# Altium footprint library 1541 Interface for ZX-81.PcbLib: 24 footprints (part 1 of 2)
Each footprint in its own frame and in the unit in brackets; x right, y up, seen from the top. Pads: shape width x height; smd on the part's side, far side on the other; paste and mask are expansions set on the pad; w line width, h text height; cw(c..) or ccw(c..) is an arc to the next point about the centre after c.
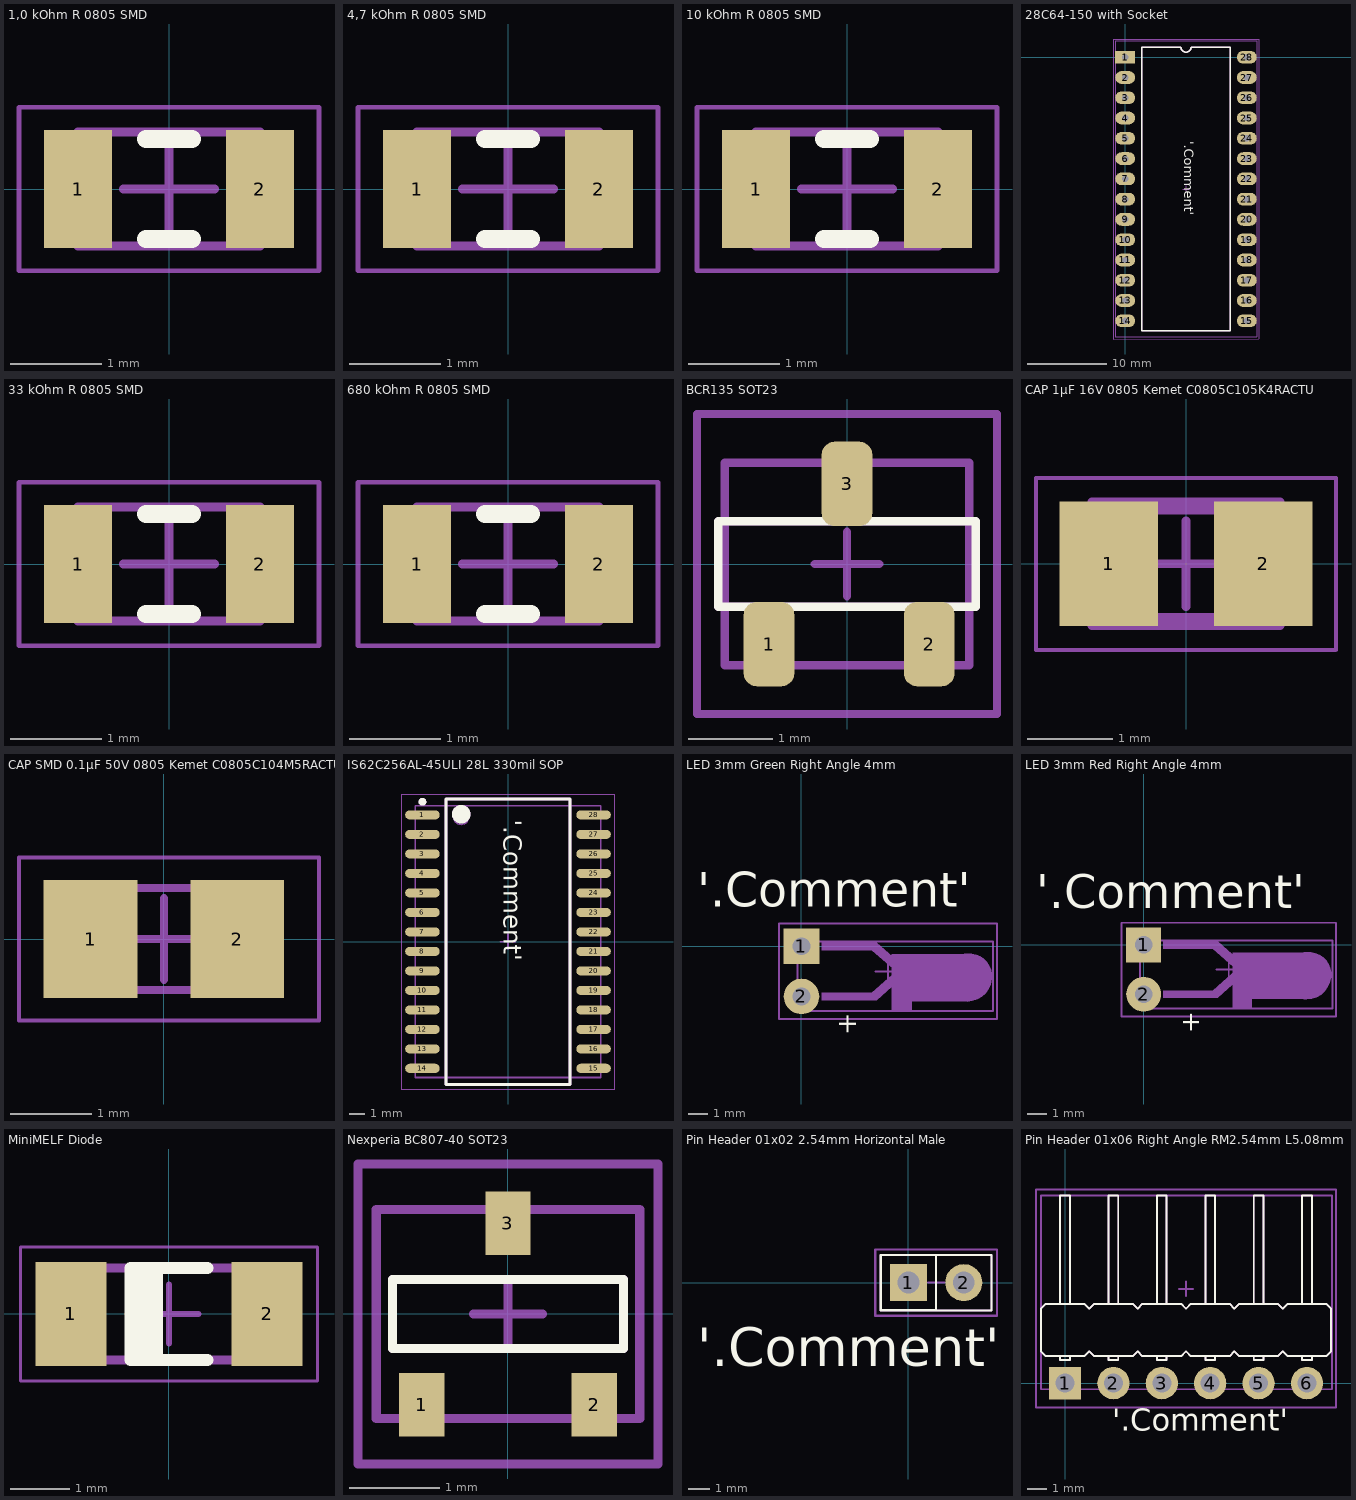
[diagram p0: the footprints below, top view; thin cyan lines are the x and y axes]

## 1,0 kOhm R 0805 SMD [mm] "Chip Resistor, 2-Leads, Body 2,00x1,25mm, IPC Medium Density"
height 0.5
pads (2):
  rect 0.75x1.3 smd: 1(-1,0) 2(1,0)
Top Overlay:
  lines w0.2: -0.25,-0.55 0.25,-0.55 ; -0.25,0.55 0.25,0.55
Top 3D Body:
  lines w0.1: -1,-0.625 -1,0.625 1,0.625 1,-0.625 -1,-0.625
Top Courtyard:
  lines w0.05: -1.65,-0.9 -1.65,0.9 1.65,0.9 1.65,-0.9 -1.65,-0.9
  lines w0.1: -0.5,0 0.5,0 ; 0,-0.5 0,0.5
Top Assembly:
  lines w0.1: -1,-0.625 1,-0.625 1,0.625 -1,0.625 -1,-0.625
  text "'.Designator'" at 2.034,-0.654 h2
  text "'.Comment'" at -0.843,1.263 h2
3D body: height 0.5, standoff 0, extent -1,-0.625 -0.65,0.625
3D body: height 0.5, standoff 0, extent 0.65,-0.625 1,0.625
3D body "Yageo RC0805 Resistor Series 102.stp": height 0.5, standoff 0, extent -1,-0.625 1,0.625

## 4,7 kOhm R 0805 SMD [mm] "Chip Resistor, 2-Leads, Body 2,00x1,25mm, IPC Medium Density"
height 0.5
pads (2):
  rect 0.75x1.3 smd: 1(-1,0) 2(1,0)
Top Overlay:
  lines w0.2: -0.25,-0.55 0.25,-0.55 ; -0.25,0.55 0.25,0.55
Top 3D Body:
  lines w0.1: -1,-0.625 -1,0.625 1,0.625 1,-0.625 -1,-0.625
Top Courtyard:
  lines w0.05: -1.65,-0.9 -1.65,0.9 1.65,0.9 1.65,-0.9 -1.65,-0.9
  lines w0.1: -0.5,0 0.5,0 ; 0,-0.5 0,0.5
Top Assembly:
  lines w0.1: -1,-0.625 1,-0.625 1,0.625 -1,0.625 -1,-0.625
  text "'.Designator'" at -3.182,1.522 h2
  text "'.Comment'" at 1.9,1.389 h2
3D body: height 0.5, standoff 0, extent -1,-0.625 -0.65,0.625
3D body: height 0.5, standoff 0, extent 0.65,-0.625 1,0.625
3D body "Yageo RC0805 Resistor Series 472.stp": height 0.5, standoff 0, extent -1,-0.625 1,0.625

## 10 kOhm R 0805 SMD [mm] "Chip Resistor, 2-Leads, Body 2,00x1,25mm, IPC Medium Density"
height 0.5
pads (2):
  rect 0.75x1.3 smd: 1(-1,0) 2(1,0)
Top Overlay:
  lines w0.2: -0.25,-0.55 0.25,-0.55 ; -0.25,0.55 0.25,0.55
Top 3D Body:
  lines w0.1: -1,-0.625 -1,0.625 1,0.625 1,-0.625 -1,-0.625
Top Courtyard:
  lines w0.05: -1.65,-0.9 -1.65,0.9 1.65,0.9 1.65,-0.9 -1.65,-0.9
  lines w0.1: -0.5,0 0.5,0 ; 0,-0.5 0,0.5
Top Assembly:
  lines w0.1: -1,-0.625 1,-0.625 1,0.625 -1,0.625 -1,-0.625
  text "'.Designator'" at 3.194,-1.031 h2
  text "'.Comment'" at -1.857,-1.34 h2
3D body: height 0.5, standoff 0, extent -1,-0.625 -0.65,0.625
3D body: height 0.5, standoff 0, extent 0.65,-0.625 1,0.625
3D body "Yageo RC0805 Resistor Series 103.stp": height 0.5, standoff 0, extent -1,-0.625 1,0.625

## 28C64-150 with Socket [mm]
height 1.75
pads (28):
  rect 2.5x1.6 hole 0.8: 1(0,0)
  oval 2.5x1.6 hole 0.8: 2(0,-2.54) 3(0,-5.08) 4(0,-7.62) 5(0,-10.16) 6(0,-12.7) 7(0,-15.24) 8(0,-17.78) 9(0,-20.32) 10(0,-22.86) 11(0,-25.4) 12(0,-27.94) 13(0,-30.48) 14(0,-33.02) 15(15.24,-33.02) 16(15.24,-30.48) 17(15.24,-27.94) 18(15.24,-25.4) 19(15.24,-22.86) 20(15.24,-20.32) 21(15.24,-17.78) 22(15.24,-15.24) 23(15.24,-12.7) 24(15.24,-10.16) 25(15.24,-7.62) 26(15.24,-5.08) 27(15.24,-2.54) 28(15.24,0)
Top Overlay:
  lines w0.2: 2.085,-34.29 13.155,-34.29 13.155,1.27 8.255,1.27 cw(c7.62,1.27) 6.985,1.27 2.085,1.27 2.085,-34.29
  text "'.Comment'" at 6.958,-10.534 h2
Top 3D Body:
  lines w0.1: -1.27,-35.052 -1.27,2.04 16.51,2.04 16.51,-35.052 -1.27,-35.052
Top Courtyard:
  lines w0.1: 7.239,-16.51 8.001,-16.51 ; 7.62,-16.891 7.62,-16.129 ; -1.524,-35.306 -1.524,2.286 16.764,2.286 16.764,-35.306 -1.524,-35.306
Top Assembly:
  lines w0.2: 2.085,-34.29 13.155,-34.29 13.155,1.27 8.255,1.27 cw(c7.62,1.27) 6.985,1.27 2.085,1.27 2.085,-34.29
  text "'.Comment'" at 6.958,-10.534 h2
  text "'.Designator'" at -3.193,-15.485 h2
3D body "28C64-150 with Socket.stp": height 8.64, standoff -2.7, extent -1.27,-35.06 16.51,2.04

## 33 kOhm R 0805 SMD [mm] "Chip Resistor, 2-Leads, Body 2,00x1,25mm, IPC Medium Density"
height 0.5
pads (2):
  rect 0.75x1.3 smd: 1(-1,0) 2(1,0)
Top Overlay:
  lines w0.2: -0.25,-0.55 0.25,-0.55 ; -0.25,0.55 0.25,0.55
Top 3D Body:
  lines w0.1: -1,-0.625 -1,0.625 1,0.625 1,-0.625 -1,-0.625
Top Courtyard:
  lines w0.05: -1.65,-0.9 -1.65,0.9 1.65,0.9 1.65,-0.9 -1.65,-0.9
  lines w0.1: -0.5,0 0.5,0 ; 0,-0.5 0,0.5
Top Assembly:
  lines w0.1: -1,-0.625 1,-0.625 1,0.625 -1,0.625 -1,-0.625
  text "'.Designator'" at 2.139,-0.65 h2
  text "'.Comment'" at -1.4,1.251 h2
3D body: height 0.5, standoff 0, extent -1,-0.625 -0.65,0.625
3D body: height 0.5, standoff 0, extent 0.65,-0.625 1,0.625
3D body "Yageo RC0805 Resistor Series 333.stp": height 0.5, standoff 0, extent -1,-0.625 1,0.625

## 680 kOhm R 0805 SMD [mm] "Chip Resistor, 2-Leads, Body 2,00x1,25mm, IPC Medium Density"
height 0.5
pads (2):
  rect 0.75x1.3 smd: 1(-1,0) 2(1,0)
Top Overlay:
  lines w0.2: -0.25,-0.55 0.25,-0.55 ; -0.25,0.55 0.25,0.55
Top 3D Body:
  lines w0.1: -1,-0.625 -1,0.625 1,0.625 1,-0.625 -1,-0.625
Top Courtyard:
  lines w0.05: -1.65,-0.9 -1.65,0.9 1.65,0.9 1.65,-0.9 -1.65,-0.9
  lines w0.1: -0.5,0 0.5,0 ; 0,-0.5 0,0.5
Top Assembly:
  lines w0.1: -1,-0.625 1,-0.625 1,0.625 -1,0.625 -1,-0.625
  text "'.Comment'" at 1.144,2.558 h2
  text "'.Designator'" at 3.18,-1.031 h2
3D body: height 0.5, standoff 0, extent -1,-0.625 -0.65,0.625
3D body: height 0.5, standoff 0, extent 0.65,-0.625 1,0.625
3D body "Yageo RC0805 Resistor Series 684.stp": height 0.5, standoff 0, extent -1,-0.625 1,0.625

## BCR135 SOT23 [mm]
height 1.75
pads (3):
  rrect50% 0.6x1 smd: 1(-0.924,-0.95) 2(0.976,-0.95) 3(0,0.95)
Top Overlay:
  lines w0.1: -1.524,-0.508 1.524,-0.508 1.524,0.508 -1.524,0.508 -1.524,-0.508
Top 3D Body:
  lines w0.1: -1.45,-1.2 -1.45,1.2 1.45,1.2 1.45,-1.2 -1.45,-1.2
Top Courtyard:
  lines w0.1: -0.381,0 0.381,0 ; 0,-0.381 0,0.381 ; -1.778,-1.778 1.778,-1.778 1.778,1.778 -1.778,1.778 -1.778,-1.778
Top Assembly:
  lines w0.1: -1.524,-0.508 1.524,-0.508 1.524,0.508 -1.524,0.508 -1.524,-0.508
  text "'.Designator'" at -1.113,-3.24 h2
  text "'.Comment'" at -3.276,1.878 h2
3D body "BCR135 SOT23.stp": height 1, standoff 0, extent -1.45,-1.15 1.45,1.15

## CAP 1µF 16V 0805 Kemet C0805C105K4RACTU [mm] "Chip Capacitor, 2-Leads, Body 2,00x1,25mm, IPC Medium Density"
height 1
pads (2):
  rect 1.15x1.45 smd: 1(-0.9,0) 2(0.9,0)
Top 3D Body:
  lines w0.1: -1,-0.625 1,-0.625 1,0.625 -1,0.625 -1,-0.625
Top Courtyard:
  lines w0.05: -1.751,-1.007 1.749,-1.007 ; -1.751,-1 -1.751,1 1.749,1 ; 1.751,-1 1.751,1
  lines w0.1: -0.5,0 0.5,0 ; 0,-0.5 0,0.5
Top Assembly:
  lines w0.1: -1.1,-0.725 -1.1,0.725 1.1,0.725 1.1,-0.725 -1.1,-0.725
  text "'.Designator'" at -1.059,-2.567 h2
  text "'.Comment'" at -4.381,1.085 h2
3D body "CAP 1µF 16V 0805 Kemet C0805C105K4RACTU.stp": height 1, standoff 0, extent -1,-0.625 1,0.625

## CAP SMD 0.1µF 50V 0805 Kemet C0805C104M5RACTU [mm] "Chip Capacitor, 2-Leads, Body 2,00x1,25mm, IPC Medium Density"
height 0.78
pads (2):
  rect 1.15x1.45 smd: 1(-0.9,0) 2(0.9,0)
Top 3D Body:
  lines w0.1: -1,-0.625 1,-0.625 1,0.625 -1,0.625 -1,-0.625
Top Courtyard:
  lines w0.05: -1.778,-1 1.905,-1 1.905,1 -1.778,1 -1.778,-1
  lines w0.1: -0.5,0 0.5,0 ; 0,-0.5 0,0.5
Top Assembly:
  text "'.Comment'" at -1.455,0.315 h2
  text "'.Designator'" at 3.467,-1.059 h2
3D body "CAP SMD 0.1µF 50V 0805 Kemet C0805C104M5RACTU.stp": height 0.78, standoff 0, extent -1,-0.625 1,0.625

## IS62C256AL-45ULI 28L 330mil SOP [mm] "SOP, 28-Leads, Body 18,16x8,57mm, Pitch 1,27mm, IPC Medium Density"
height 3.05
pads (28):
  oval 2.25x0.6 smd: 1(-5.575,8.255) 2(-5.575,6.985) 3(-5.575,5.715) 4(-5.575,4.445) 5(-5.575,3.175) 6(-5.575,1.905) 7(-5.575,0.635) 8(-5.575,-0.635) 9(-5.575,-1.905) 10(-5.575,-3.175) 11(-5.575,-4.445) 12(-5.575,-5.715) 13(-5.575,-6.985) 14(-5.575,-8.255) 15(5.575,-8.255) 16(5.575,-6.985) 17(5.575,-5.715) 18(5.575,-4.445) 19(5.575,-3.175) 20(5.575,-1.905) 21(5.575,-0.635) 22(5.575,0.635) 23(5.575,1.905) 24(5.575,3.175) 25(5.575,4.445) 26(5.575,5.715) 27(5.575,6.985) 28(5.575,8.255)
Top Overlay:
  circle w0.25: c-5.575,9.105 r0.125
  circle w0.6: c-3.05,8.3 r0.3
  lines w0.2: -4.05,-9.3 -4.05,9.3 4.05,9.3 4.05,-9.3 -4.05,-9.3
  text "'.Comment'" at -0.662,7.943 h2
Top 3D Body:
  circle w0.1: c-3.048,8.128 r0.5
  lines w0.1: -6.05,-8.85 -6.05,8.85 6.05,8.85 6.05,-8.85 -6.05,-8.85
Top Courtyard:
  lines w0.05: -6.95,-9.6 -6.95,9.6 6.95,9.6 6.95,-9.6 -6.95,-9.6
  lines w0.1: -0.5,0 0.5,0 ; 0,-0.5 0,0.5
Top Assembly:
  circle w0.25: c-5.575,9.105 r0.125
  circle w0.6: c-3.05,8.3 r0.3
  lines w0.2: -4.05,-9.3 -4.05,9.3 4.05,9.3 4.05,-9.3 -4.05,-9.3
  text "'.Comment'" at -0.662,7.943 h2
  text "'.Designator'" at -8.574,4.829 h2
3D body "IS62C256AL-45ULI 28L 330mil SOP.stp": height 3, standoff 0, extent -6.05,-8.85 6.05,8.85

## LED 3mm Green Right Angle 4mm [mm]
height 1.75
pads (2):
  rect 1.8x1.8 hole 0.9: 1(0,0)
  round 1.8 hole 0.9: 2(0,-2.54)
Top Overlay:
  text "'.Comment'" at -5.295,1.42 h3
  text "+" at 1.905,-3.359 h1
Top 3D Body:
  lines w0.1: -0.2,-3.27 -0.2,0.23 9.715,0.23 9.715,-3.27 -0.2,-3.27
Top Courtyard:
  lines w0.1: 3.746,-1.27 5.016,-1.27 ; 4.381,-1.905 4.381,-0.635 ; -1.143,-3.683 -1.143,1.143 0.127,1.143 9.906,1.143 9.906,-3.683 -1.143,-3.683
Top Assembly:
  rectangle: 5.461,-2.794 8.382,-0.381
  rectangle: 4.572,-3.302 5.588,-0.381
  region: 1.016,-2.349 3.81,-2.349 3.81,-2.73 1.016,-2.73
  region: 1.016,0.191 3.81,0.191 3.81,-0.191 1.016,-0.191
  region: 3.81,0.191 4.826,-0.716 4.826,-1.301 3.556,-0.191
  region: 3.81,-2.73 4.826,-1.824 4.826,-1.239 3.556,-2.349
  region: 8.255,-0.381 8.255,-2.788 8.387,-2.801 8.652,-2.772 8.905,-2.689 9.135,-2.555 9.333,-2.377 9.489,-2.161 9.597,-1.918 9.652,-1.657 9.652,-1.524 9.652,-1.411 9.608,-1.191 9.522,-0.983 9.397,-0.795 9.238,-0.636 9.05,-0.511 8.842,-0.425 8.622,-0.381 8.509,-0.381
  text "+" at 0.889,-1.524 h1
  text "'.Designator'" at 2.723,3.559 h2
  text "'.Comment'" at -5.803,1.581 h3
3D body "LED 3mm Green generic Right Angle 4mm.stp": height 4, standoff -3, extent -0.2,-3.27 9.715,0.23

## LED 3mm Red Right Angle 4mm [mm]
pads (2):
  rect 1.8x1.8 hole 0.9: 1(0,0)
  round 1.8 hole 0.9: 2(0,-2.54)
Top Overlay:
  text "'.Comment'" at -5.549,1.294 h3
  text "+" at 2.032,-3.429 h1
Top 3D Body:
  lines w0.1: -0.2,-3.27 -0.2,0.23 9.715,0.23 9.715,-3.27 -0.2,-3.27
Top Courtyard:
  lines w0.1: 3.746,-1.27 5.016,-1.27 ; 4.381,-1.905 4.381,-0.635 ; -1.143,-3.683 -1.143,1.143 0.127,1.143 9.906,1.143 9.906,-3.683 -1.143,-3.683
Top Assembly:
  rectangle: 5.461,-2.793 8.382,-0.38
  rectangle: 4.572,-3.303 5.588,-0.382
  region: 1.016,-2.349 3.81,-2.349 3.81,-2.73 1.016,-2.73
  region: 1.016,0.191 3.81,0.191 3.81,-0.191 1.016,-0.191
  region: 3.81,0.191 4.826,-0.716 4.826,-1.301 3.556,-0.191
  region: 3.81,-2.73 4.826,-1.824 4.826,-1.239 3.556,-2.349
  region: 8.255,-0.381 8.255,-2.788 8.387,-2.801 8.652,-2.772 8.905,-2.689 9.135,-2.555 9.333,-2.377 9.489,-2.161 9.597,-1.918 9.652,-1.657 9.652,-1.524 9.652,-1.411 9.608,-1.191 9.522,-0.983 9.397,-0.795 9.238,-0.636 9.05,-0.511 8.842,-0.425 8.622,-0.381 8.509,-0.381
  text "+" at 0.889,-1.524 h1
  text "'.Designator'" at 2.723,3.559 h2
  text "'.Comment'" at -5.803,1.581 h3
3D body "LED 3mm Red generic Right Angle 4mm.stp": height 4, standoff -3, extent -0.2,-3.27 9.715,0.23

## MiniMELF Diode [mm] "MELF Diode, 2-Leads, Body 3,50x1,50mm, IPC Medium Density"
height 1.6
pads (2):
  rect 1.2x1.75 smd: 1(-1.65,0) 2(1.65,0)
Top Overlay:
  rectangle: -0.65,-0.775 -0.1,0.775
  lines w0.2: 0.65,-0.775 -0.65,-0.775 -0.65,0.775 0.65,0.775
Top 3D Body:
  lines w0.1: -1.75,-0.75 -1.75,0.75 1.75,0.75 1.75,-0.75 -1.75,-0.75
Top Courtyard:
  lines w0.05: -2.5,-1.125 2.5,-1.125 2.5,1.125 -2.5,1.125 -2.5,-1.125
  lines w0.1: -0.5,0 0.5,0 ; 0,-0.5 0,0.5
Top Assembly:
  lines w0.1: -1.85,-0.8 1.85,-0.8 1.85,0.8 -1.85,0.8 -1.85,-0.8
  text "'.Comment'" at -2.529,1.252 h2
  text "'.Designator'" at 2.522,1.034 h2
3D body "LL4148 MiniMELF.stp": height 1.5, standoff 0, extent -1.75,-0.75 1.75,0.75

## Nexperia BC807-40 SOT23 [mm]
pads (3):
  rect 0.5x0.7 smd: 1(-0.95,-1) 2(0.95,-1) 3(0,1)
Top Overlay:
  lines w0.1: -1.27,-0.381 1.27,-0.381 1.27,0.381 -1.27,0.381 -1.27,-0.381
Top 3D Body:
  text "'.Designator'" at -2.035,-0.7 h2
Top Courtyard:
  lines w0.1: -0.381,0 0.381,0 ; 0,-0.381 0,0.381 ; -1.651,-1.651 1.651,-1.651 1.651,1.651 -1.651,1.651 -1.651,-1.651
Top Assembly:
  lines w0.1: -1.45,-1.15 1.45,-1.15 1.45,1.15 -1.45,1.15 -1.45,-1.15 ; -1.27,-0.381 1.27,-0.381 1.27,0.381 -1.27,0.381 -1.27,-0.381
  text "'.Comment'" at 2.118,-0.662 h2
3D body "BC807-40 SOT23.stp": height 1, standoff 0, extent -1.45,-1.15 1.45,1.15

## Pin Header 01x02 2.54mm Horizontal Male [mm]
pads (2):
  rect 1.7x1.7 hole 1: 1(0,0)
  round 1.7 hole 1: 2(2.54,0)
Top Overlay:
  lines w0.1: 1.27,-1.272 3.81,-1.272 3.81,1.268 1.27,1.268 ; -1.272,-1.27 1.268,-1.27 1.268,1.27 -1.272,1.27 -1.272,-1.27
  text "'.Comment'" at -9.711,-4.405 h3
Top Courtyard:
  lines w0.1: 0.889,0 1.651,0 ; 1.27,-0.381 1.27,0.381 ; -1.524,-1.524 4.064,-1.524 4.064,1.524 -1.524,1.524 -1.524,-1.524
Top Assembly:
  lines w0.1: 1.27,-1.272 3.81,-1.272 3.81,1.268 1.27,1.268 ; -1.272,-1.27 -1.272,1.27 1.268,1.27 1.268,-1.27 -1.272,-1.27
  text "'.Comment'" at -9.838,-4.405 h3
  text "'.Designator'" at -3.559,1.456 h2
3D body "Pin Header Male 01x02 P2.54mm.stp": height 8.34, standoff -3.05, extent -1.27,-1.273 3.81,1.267

## Pin Header 01x06 Right Angle RM2.54mm L5.08mm [mm]
height 1.75
pads (6):
  rect 1.7x1.7 hole 1: 1(0,0)
  round 1.7 hole 1: 2(2.54,0) 3(5.08,0) 4(7.62,0) 5(10.16,0) 6(12.7,0)
Top Overlay:
  lines w0.1: -0.254,1.422 -0.254,1.219 0.254,1.219 0.254,1.422 ; -0.254,4.166 -0.254,9.855 0.254,9.855 0.254,4.166 ; 2.286,1.422 2.286,1.219 2.794,1.219 2.794,1.422 ; 2.286,4.166 2.286,9.855 2.794,9.855 2.794,4.166 ; 4.826,1.422 4.826,1.219 5.334,1.219 5.334,1.422 ; 4.826,4.166 4.826,9.855 5.334,9.855 5.334,4.166 ; 7.366,1.422 7.366,1.219 7.874,1.219 7.874,1.422 ; 7.366,4.166 7.366,9.855 7.874,9.855 7.874,4.166 ; 9.906,1.422 9.906,1.219 10.414,1.219 10.414,1.422 ; 9.906,4.166 9.906,9.855 10.414,9.855 10.414,4.166 ; 12.446,1.422 12.446,1.219 12.954,1.219 12.954,1.422 ; 12.446,4.166 12.446,9.855 12.954,9.855 12.954,4.166 ; -1.27,1.676 -1.27,3.912 -1.016,4.165 1.016,4.166 1.27,3.912 1.524,4.165 3.556,4.166 3.81,3.912 4.064,4.165 6.096,4.166 6.35,3.912 6.604,4.165 8.636,4.166 8.89,3.912 9.144,4.165 11.176,4.166 11.43,3.912 11.684,4.165 13.716,4.166 13.97,3.912 13.97,1.676 13.716,1.422 11.684,1.422 11.43,1.676 11.176,1.422 9.144,1.422 8.89,1.676 8.636,1.422 6.604,1.422 6.35,1.676 6.096,1.422 4.064,1.422 3.81,1.676 3.556,1.422 1.524,1.422 1.27,1.676 1.016,1.422 -1.016,1.422 -1.27,1.676
  text "'.Comment'" at 2.48,-2.897 h2
Top 3D Body:
  lines w0.1: -1.27,-0.32 14.02,-0.32 14.02,9.86 -1.27,9.86 -1.27,-0.32
Top Courtyard:
  lines w0.1: 5.969,4.953 6.731,4.953 ; 6.35,4.572 6.35,5.334 ; -1.524,-1.27 -1.524,10.16 14.224,10.16 14.224,-1.27 -1.524,-1.27
Top Assembly:
  lines w0.1: -0.254,1.422 -0.254,1.219 0.254,1.219 0.254,1.422 ; -0.254,4.166 -0.254,9.855 0.254,9.855 0.254,4.166 ; 2.286,1.422 2.286,1.219 2.794,1.219 2.794,1.422 ; 2.286,4.166 2.286,9.855 2.794,9.855 2.794,4.166 ; 4.826,1.422 4.826,1.219 5.334,1.219 5.334,1.422 ; 4.826,4.166 4.826,9.855 5.334,9.855 5.334,4.166 ; 7.366,1.422 7.366,1.219 7.874,1.219 7.874,1.422 ; 7.366,4.166 7.366,9.855 7.874,9.855 7.874,4.166 ; 9.906,1.422 9.906,1.219 10.414,1.219 10.414,1.422 ; 9.906,4.166 9.906,9.855 10.414,9.855 10.414,4.166 ; 12.446,1.422 12.446,1.219 12.954,1.219 12.954,1.422 ; 12.446,4.166 12.446,9.855 12.954,9.855 12.954,4.166 ; -1.27,1.676 -1.27,3.912 -1.016,4.165 1.016,4.166 1.27,3.912 1.524,4.165 3.556,4.166 3.81,3.912 4.064,4.165 6.096,4.166 6.35,3.912 6.604,4.165 8.636,4.166 8.89,3.912 9.144,4.165 11.176,4.166 11.43,3.912 11.684,4.165 13.716,4.166 13.97,3.912 13.97,1.676 13.716,1.422 11.684,1.422 11.43,1.676 11.176,1.422 9.144,1.422 8.89,1.676 8.636,1.422 6.604,1.422 6.35,1.676 6.096,1.422 4.064,1.422 3.81,1.676 3.556,1.422 1.524,1.422 1.27,1.676 1.016,1.422 -1.016,1.422 -1.27,1.676
  text "'.Comment'" at 2.48,-2.897 h2
  text "'.Designator'" at 14.07,3.271 h2
3D body "Male Pin Heaer 01x06 RM2.54mm L=5.08mm.stp": height 2.5, standoff -3.05, extent -1.27,-0.32 14.02,9.86